# Altium integrated library Integrated_Library - 02.02.25 - 22.49.IntLib: 792 symbols (part 4 of 11)
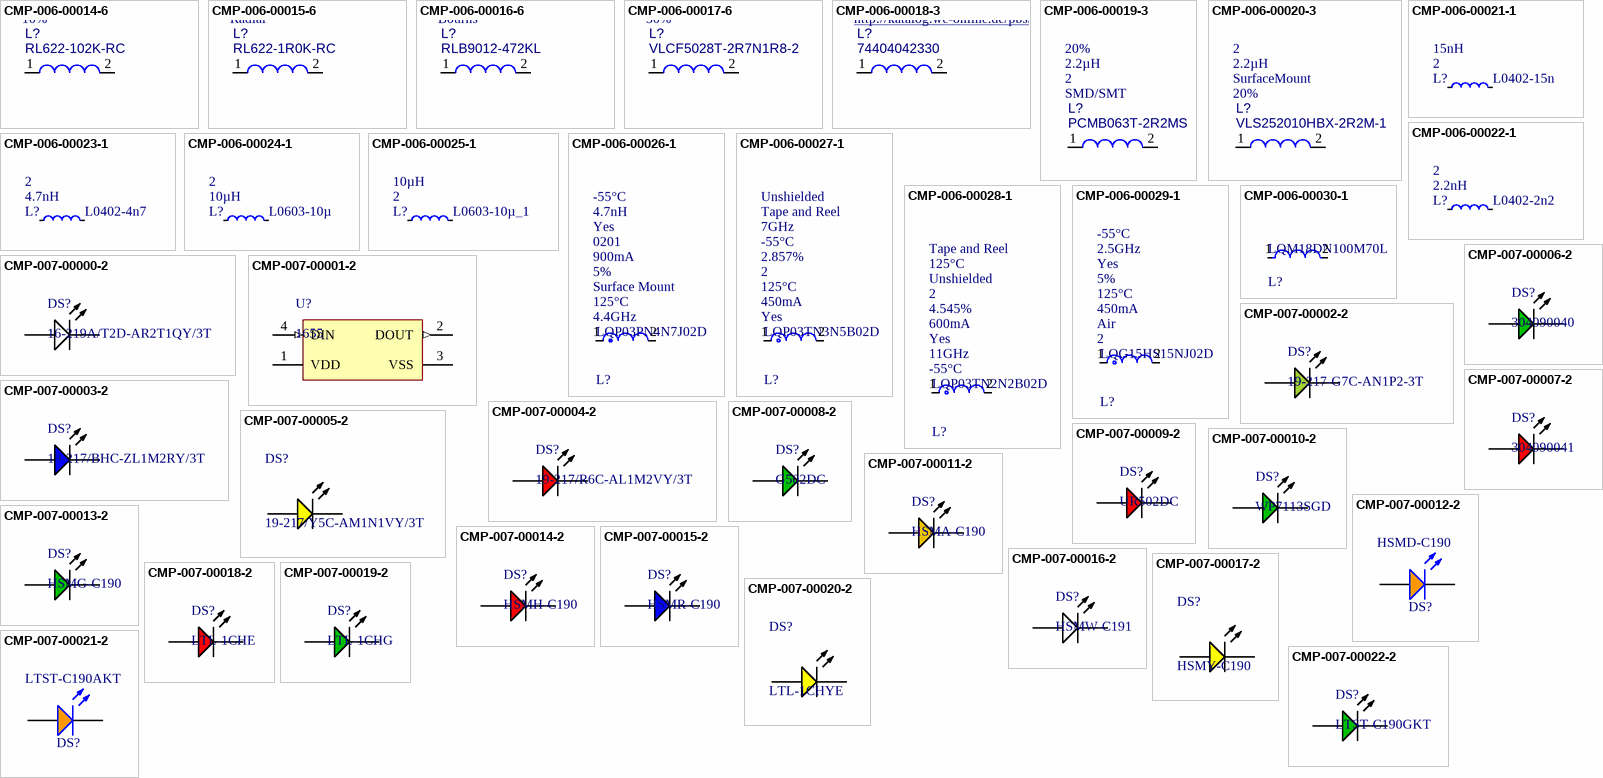
[diagram p29: symbols CMP-006-00014-6 to CMP-007-00022-2]

## CMP-006-00027-1
designator L?, comment LQP03TN3N5B02D  RoHS Compliant: Yes  Max Current Rating: 450mA  Max Operating Temperature: 125°C  Pins: 2  Tolerance: 2.857%  Min Operating Temperature: -55°C  Self Resonant Frequency: 7GHz  Packaging: Tape and Reel  Shielding: Unshielded
General Purpose Inductor, 0.0035uH, 2.857%, 1 Element, SMD, 0201; DC Resistance (DCR): 250mR; Package Height: 0.3mm; Case/Size Code: 0201; Quality Factor-Min (at L-nom): 14; Shape/Size Description: RECTANGULAR PACKAGE; Inductor Application: RF INDUCTOR; Package Length: 0.6mm; Channels: 1; Test Frequency: 500MHz; Inductor Type: GENERAL PURPOSE INDUCTOR; Terminal Placement: Dual Ended; Terminal Finish: Tin; Construction: Chip; Termination: Wraparound; Package Width: 0.3mm; Inductance-Nom (L): 0.0035uH; JESD-609 Code: e3; Surface Mount: Yes; Package Style: SMTMeter; Reach SVHC Compliant: Yes
footprint FP-LQP03TG_02-IPC_B
pins: 1, 2

## CMP-006-00028-1
designator L?, comment LQP03TN2N2B02D  Min Operating Temperature: -55°C  Self Resonant Frequency: 11GHz  RoHS Compliant: Yes  Max Current Rating: 600mA  Tolerance: 4.545%  Pins: 2  Shielding: Unshielded  Max Operating Temperature: 125°C  Packaging: Tape and Reel
General Purpose Inductor, 0.0022uH, 4.545%, 1 Element, SMD, 0201; Package Width: 0.3mm; Inductor Application: RF INDUCTOR; Package Length: 0.6mm; Test Frequency: 500MHz; Channels: 1; Case/Size Code: 0201; Shape/Size Description: RECTANGULAR PACKAGE; DC Resistance (DCR): 150mR; Quality Factor-Min (at L-nom): 14; Terminal Placement: Dual Ended; Surface Mount: Yes; Reach SVHC Compliant: Yes; Inductance-Nom (L): 0.0022uH; Construction: Chip; JESD-609 Code: e3; Terminal Finish: Nickel; Inductor Type: GENERAL PURPOSE INDUCTOR; Package Style: SMTMeter; Termination: Wraparound; Package Height: 0.3mm
footprint FP-LQP03TG_02-IPC_B-32
pins: 1, 2

## CMP-006-00029-1
designator L?, comment LQG15HS15NJ02D  Pins: 2  Core Material: Air  Max Current Rating: 450mA  Max Operating Temperature: 125°C  Tolerance: 5%  RoHS Compliant: Yes  Self Resonant Frequency: 2.5GHz  Min Operating Temperature: -55°C
General Purpose Inductor, 0.015uH, 5%, 1 Element, Air-Core, SMD, 0402; DC Resistance (DCR): 320mR; Case/Size Code: 0402; Construction: Multilayer Chip
footprint FP-LQG15HH_02-MFG
footprint FP-LQG15HH_02-IPC_B
footprint FP-LQG15HH_02-IPC_A
footprint FP-LQG15HH_02-IPC_C
pins: 1, 2

## CMP-006-00030-1
designator L?, comment LQM18DN100M70L
General Purpose Inductor, 10uH, 20%, 1 Element, Ferrite-Core, SMD, 0603
footprint FP-LQM18DN_70-IPC_C
footprint FP-LQM18DN_70-IPC_B
footprint FP-LQM18DN_70-IPC_A
footprint FP-LQM18DN_70-MFG
pins: 1, 2

## CMP-007-00000-2
designator DS?, comment 16-219A/T2D-AR2T1QY/3T
Chip LED, White, 5 V, 10 mA, 30 mW, -40 to 85 degC, 2-Pin SMD (0402), RoHS, Tape and Reel; Manufacturer: Everlight Electronics; Luminous Intensity: 360mcd; Forward Voltage: 2.6V; Viewing Angle: 130degrees; Power: 30mW; Forward Current: 5mA; Package Quantity: 3000; Max Operating Temperature: 85°C; Datasheet Version: Rev. 5, 04/2013; Datasheet URL: http://www.everlight.com/file/ProductFile/16-219A-T2D-AR2T1QY-3T.pdf; Package Reference: 0402; Mounting Technology: SM; Case/Package: 0402; Illumination Colour: White; Manufacturer URL: http://www.everlight.com/; Package Description: 2-Pin Surface Mount Device, Body 1 x 0.5 mm; RoHS Compliant: True; Packaging: TapeandReel; Min Operating Temperature: -40°C
footprint EVRL-0402-2_V (SMD, 2-Leads, Body 1x0.5mm)
pins: 1 A, 2 K

## CMP-007-00001-2
designator U?, comment 1655
Intelligent Control LED Integrated Light Source, 3.5 to 5.3 V, -25 to 80 degC, 4-Pin SMD, RoHS, Tape and Reel; Manufacturer: Adafruit Industries; RoHS Compliant: True; Case/Package: 1655; Package Description: 4-Pin Surface Mount Device, Body 5 x 5 mm; Manufacturer URL: https://www.adafruit.com/; Package Reference: 1655; Datasheet URL: http://datasheet.octopart.com/ADA1655-Adafruit-Industries-datasheet-32028139.pdf; Datasheet Version: May-13; Mounting Technology: SM
footprint ADA-RGB-1655_V (SMD, 4-Leads, Body 5x5mm)
pins: 1 VDD (power), 2 DOUT (out), 3 VSS (power), 4 DIN (in)

## CMP-007-00002-2
designator DS?, comment 19-217-G7C-AN1P2-3T
Chip LED, Yellow-Green, 5 V, 25 mA, -40 to 85 degC, 2-Pin SMD (0603), RoHS, Tape and Reel; Manufacturer: Everlight Electronics; Forward Voltage: 2V; Lens Style: Clear; Viewing Angle: 120degrees; Colour: Green; Mounting Technology: SM; Datasheet Version: Rev. 1, 04/2006; Package Description: 2-Pin Surface Mount Device, Body 1.6 x 0.8 mm; RoHS Compliant: True; Package Reference: 0603; Pins: 2; Manufacturer URL: http://www.everlight.com/; Datasheet URL: https://datasheet.ciiva.com/48679/19-217-g7c-an1p2-3t-48679179.pdf; Case/Package: 0603
footprint EVRL-0603-2_V (SMD, 2-Leads, Body 1.6x0.8mm)
pins: 1 A, 2 K

## CMP-007-00003-2
designator DS?, comment 19-217/BHC-ZL1M2RY/3T
Chip LED, Blue, 5 V, 25 mA, -40 to 85 degC, 2-Pin SMD (0603), RoHS, Tape and Reel; Manufacturer: Everlight Electronics; Luminous Intensity: 28.5mcd; Viewing Angle: 120degrees; Forward Current: 25mA; Lens Style: Diffused; Forward Voltage: 3V; Pins: 2; Max Operating Temperature: 85°C; Manufacturer URL: http://www.everlight.com/; Datasheet URL: https://datasheet.ciiva.com/26901/getdatasheetpartid-420616-26901324.pdf; Package Reference: 0603; RoHS Compliant: True; Packaging: TapeandReel; Package Description: 2-Pin Surface Mount Device, Body 1.6 x 0.8 mm; Mounting Technology: SM; Datasheet Version: Rev. 1.0, 03/2003; Min Operating Temperature: -40°C; Case/Package: 0603; Colour: Blue
footprint EVRL-0603-2_V (SMD, 2-Leads, Body 1.6x0.8mm)
pins: 1 A, 2 K

## CMP-007-00004-2
designator DS?, comment 19-217/R6C-AL1M2VY/3T
Chip LED, Red, 5 V, 25 mA, -40 to 85 degC, 2-Pin SMD (0603), RoHS, Tape and Reel; Manufacturer: Everlight Electronics; Forward Voltage: 2.2V; Lens Style: Clear; Package Reference: 0603; Datasheet Version: Rev. 1, 01/2005; Mounting Technology: SM; RoHS Compliant: False; Datasheet URL: https://datasheet.ciiva.com/4688/el-19-217-r6c-al1m2vy-3tpdf-187026-4688713.pdf; Case/Package: 0603; Colour: Red; Manufacturer URL: http://www.everlight.com/; Package Description: 2-Pin Surface Mount Device, Body 1.6 x 0.8 mm
footprint EVRL-0603-2_V (SMD, 2-Leads, Body 1.6x0.8mm)
pins: 1 A, 2 K

## CMP-007-00005-2
designator DS?, comment 19-217/Y5C-AM1N1VY/3T
Chip LED, Yellow, 5 V, 25mA, -40 to 85 degC, 2-Pin SMD (0603), RoHS, Tape and Reel; Manufacturer: Everlight Electronics; Datasheet Version: Rev. 1.0, 12/2005; Package Reference: 0603; Mounting Technology: SM; Package Description: 2-Pin Surface Mount Device, Body 1.6 x 0.8 mm; Case/Package: 0603; Datasheet URL: http://www.fairchip.com/pdf/Everlight/19-217-Y5C-AM1N1VY-3T.pdf; Manufacturer URL: http://www.everlight.com/; RoHS Compliant: False
footprint EVRL-0603-2_V (SMD, 2-Leads, Body 1.6x0.8mm)
pins: 1 A, 2 K

## CMP-007-00006-2
designator DS?, comment 304090040
Green LED, 80 mW, 20 mA, -25 to 85 degC, 2-Pin THD; Manufacturer: Shenzhen CGX; Manufacturer URL: http://szcgx.com/; Package Reference: 304090040; Datasheet Version: Rev. 1.0, 09/2014; RoHS Compliant: Unknown; Case/Package: 304090040; Package Description: 2-Pin Through Hole Device, Dia 3 mm, Pitch 2.28 mm; Datasheet URL: http://datasheet.octopart.com/304090040-Chengguangxing-datasheet-62330655.pdf; Mounting Technology: TH
footprint LED-2P-2.28-3MM (LED, 2-Leads, Dia 3mm, Pitch 2.28mm)
pins: 1 A, 2 K

## CMP-007-00007-2
designator DS?, comment 304090041
Red LED, 80 mW, 30 mA, -25 to 85 degC, 2-Pin THD; Manufacturer: Shenzhen CGX; Package Description: 2-Pin Through Hole Device, Dia 3 mm, Pitch 2.28 mm; Datasheet URL: http://datasheet.octopart.com/304090041-Chengguangxing-datasheet-62330656.pdf; Mounting Technology: TH; Manufacturer URL: http://szcgx.com/; RoHS Compliant: Unknown; Datasheet Version: Sep-14; Case/Package: 304090041; Package Reference: 304090041
footprint LED-2P-2.28-3MM_A (LED, 2-Leads, Dia 3mm, Pitch 2.28mm)
pins: 1 A, 2 K

## CMP-007-00008-2
designator DS?, comment G502DC
Green LED, 80 mW, 20 mA, -25 to 85 degC, 2-Pin THD; Manufacturer: Shenzhen CGX; Mounting Technology: TH; Package Reference: G502DC; Datasheet Version: Sep-14; Manufacturer URL: http://szcgx.com/; Package Description: 2-Pin Through Hole Device, Dia 5.9 mm; Datasheet URL: http://datasheet.octopart.com/G502DC-Chengguangxing-datasheet-62330340.pdf; Case/Package: G502DC; RoHS Compliant: Unknown
footprint CGX-G502DC (THD, 2-Leads, Dia 5.9mm, Pin Spacing 2.54mm)
pins: 1 A, 2 K

## CMP-007-00009-2
designator DS?, comment UR502DC
Red LED, 80 mW, 30 mA, -25 to 85 degC, 2-Pin THD; Manufacturer: Shenzhen CGX; Power: 80mW; Case/Package: UR502DC; RoHS Compliant: Unknown; Package Description: 2-Pin Through Hole Device, Dia 5.9 mm, Height 9.1 mm; Manufacturer URL: http://szcgx.com/; Datasheet Version: Sep-14; Package Reference: UR502DC; Datasheet URL: http://datasheet.octopart.com/UR502DC-Chengguangxing-datasheet-62330342.pdf; Mounting Technology: TH
footprint CGX-UR502DC (THD, 2-Leads, Dia 5.9mm, Pin Spacing 2.54mm)
pins: 1 A, 2 K

## CMP-007-00010-2
designator DS?, comment WP7113SGD
LED Green, 62.5 mW, 25 mA, -40 to 85 degC, 2-Pin THD, RoHS, Bulk; Manufacturer: Kingbright; Lens Style: Dome; Nominal Vf: 2.2V; Power: 62.5mW; Luminous Intensity: 40mcd; Viewing Angle: 30degrees; Datasheet URL: http://www.kingbrightusa.com/images/catalog/SPEC/WP7113SGD.pdf; Datasheet Version: Rev. 6B, 01/2015; Illumination Colour: Green; Package Quantity: 1000; Package Description: 2-Pin Through Hole Device, Dia 5.9 mm, Body Length 8.6 mm; Colour: Green; Case/Package: Radial; RoHS Compliant: True; Package Reference: WP7113SGD; Mounting Technology: TH; Packaging: Bulk; Forward Voltage: 2.2V
footprint KING-WP7113SGD_V (THD, 2-Leads, Dia 5.9mm, Body Length 8.6mm)
pins: 1 A, 2 K

## CMP-007-00011-2
designator DS?, comment HSMA-C190
LED Uni-Color Amber, 60 mW, 20 mA, -40 to 85 degC, 2-Pin SMD, RoHS, Tape and Reel; Manufacturer: Avago; Forward Current: 20mA; Colour: Orange; Luminous Intensity: 90mcd; Lens Style: Diffused; Power: 60mW; Nominal Vf: 1.9V; Viewing Angle: 170degrees; Datasheet Version: Sep-10; Mounting Technology: SM; Case/Package: 0603; RoHS Compliant: True; Pins: 2; Packaging: TapeandReel; Package Reference: HSMX-C190; Manufacturer URL: http://www.avagotech.com/; Package Quantity: 4000; Min Operating Temperature: -40°C; Datasheet URL: http://docs.avagotech.com/docs/AV02-0112EN; Max Operating Temperature: 85°C; Forward Voltage: 1.9V; Package Description: 2-Pin Surface Mount Device, Body 1.6 x 0.8 mm, Height 0.9 mm; Illumination Colour: Orange
footprint AVAG-HSMX-C190_V (SMD, 2-Leads, Body 1.6x0.8mm, Height 0.9mm)
pins: 1 A, 2 K

## CMP-007-00012-2
designator DS?, comment HSMD-C190
LED Uni-Color Orange, 52 mW, 20 mA, -40 to 85 degC, 2-Pin SMD, RoHS, Tape and Reel; Manufacturer: Avago; Lens Style: Diffused; Forward Voltage: 2.2V; Forward Current: 20mA; Viewing Angle: 170degrees; Power: 52mW; Luminous Intensity: 8mcd; Min Operating Temperature: -40°C; Packaging: TapeandReel; Colour: Orange; Nominal Vf: 2.2V; Pins: 2; Case/Package: 0603; Max Operating Temperature: 85°C; Illumination Colour: Orange; Package Description: 2-Pin Surface Mount Device, Body 1.6 x 0.8 mm, Height 0.9 mm; Manufacturer URL: http://www.avagotech.com/; Datasheet Version: Mar-12; RoHS Compliant: True; Datasheet URL: http://docs.avagotech.com/docs/AV02-0551EN; Mounting Technology: SM; Package Reference: HSMX-C190; Package Quantity: 4000
footprint AVAG-HSMX-C190_V (SMD, 2-Leads, Body 1.6x0.8mm, Height 0.9mm)
pins: 1 A, 2 K

## CMP-007-00013-2
designator DS?, comment HSMG-C190
LED Uni-Color Green, 52 mW, 20 mA, -40 to 85 degC, 2-Pin SMD, RoHS, Tape and Reel; Manufacturer: Avago; Forward Current: 20mA; Viewing Angle: 170degrees; Luminous Intensity: 15mcd; Lens Style: Diffused; Forward Voltage: 2.2V; Power: 52mW; Mounting Technology: SM; RoHS Compliant: True; Packaging: TapeandReel; Illumination Colour: Green; Datasheet URL: http://docs.avagotech.com/docs/AV02-0551EN; Min Operating Temperature: -40°C; Max Operating Temperature: 85°C; Pins: 2; Package Description: 2-Pin Surface Mount Device, Body 1.6 x 0.8 mm, Height 0.9 mm; Nominal Vf: 2.2V; Case/Package: 0603; Manufacturer URL: http://www.avagotech.com/; Datasheet Version: Mar-12; Colour: Green; Package Reference: HSMX-C190; Package Quantity: 4000
footprint AVAG-HSMX-C190_V (SMD, 2-Leads, Body 1.6x0.8mm, Height 0.9mm)
pins: 1 A, 2 K

## CMP-007-00014-2
designator DS?, comment HSMH-C190
LED Uni-Color Red, 65 mW, 20 mA, -40 to 85 degC, 2-Pin SMD, RoHS, Tape and Reel; Manufacturer: Avago; Nominal Vf: 1.8V; Luminous Intensity: 17mcd; Power: 78mW; Forward Current: 20mA; Lens Style: Diffused; Viewing Angle: 170degrees; Package Quantity: 4000; Colour: Red; Manufacturer URL: http://www.avagotech.com/; Min Operating Temperature: -40°C; Datasheet URL: http://docs.avagotech.com/docs/AV02-0551EN; RoHS Compliant: True; Forward Voltage: 1.8V; Pins: 2; Max Operating Temperature: 85°C; Packaging: TapeandReel; Package Reference: HSMX-C190; Datasheet Version: Mar-12; Package Description: 2-Pin Surface Mount Device, Body 1.6 x 0.8 mm, Height 0.9 mm; Case/Package: 0603; Mounting Technology: SM; Illumination Colour: Red
footprint AVAG-HSMX-C190_V (SMD, 2-Leads, Body 1.6x0.8mm, Height 0.9mm)
pins: 1 A, 2 K

## CMP-007-00015-2
designator DS?, comment HSMR-C190
LED Uni-Color Blue, 78 mW, 20 mA, -40 to 85 degC, 2-Pin SMD, RoHS, Tape and Reel; Manufacturer: Avago; Forward Voltage: 3.4V; Power: 78mW; Forward Current: 20mA; Luminous Intensity: 55mcd; Lens Style: Diffused; Viewing Angle: 155degrees; Pins: 2; Max Operating Temperature: 85°C; Colour: Blue; Datasheet Version: Apr-10; RoHS Compliant: True; Mounting Technology: SM; Min Operating Temperature: -40°C; Illumination Colour: Blue; Package Quantity: 4000; Datasheet URL: http://docs.avagotech.com/docs/AV02-0977EN; Package Reference: HSMX-C190; Packaging: TapeandReel; Nominal Vf: 3.4V; Case/Package: 0603; Package Description: 2-Pin Surface Mount Device, Body 1.6 x 0.8 mm, Height 0.9 mm; Manufacturer URL: http://www.avagotech.com/
footprint AVAG-HSMX-C190_V (SMD, 2-Leads, Body 1.6x0.8mm, Height 0.9mm)
pins: 1 A, 2 K

## CMP-007-00016-2
designator DS?, comment HSMW-C191
LED Uni-Color White, 78 mW, 20 mA, -40 to 85 degC, 2-Pin SMD, RoHS, Tape and Reel; Manufacturer: Avago; Power: 78mW; Lens Style: Diffused; Luminous Intensity: 200mcd; Forward Voltage: 3.6V; Viewing Angle: 140degrees; Forward Current: 20mA; Illumination Colour: White; Package Quantity: 4000; Mounting Technology: SM; Colour: White; Case/Package: 0603; Package Reference: HSMW-C191; Datasheet Version: May-10; Pins: 2; Package Description: 2-Pin Surface Mount Device, Body 1.6 x 0.8 mm; Min Operating Temperature: -40°C; RoHS Compliant: True; Packaging: TapeandReel; Manufacturer URL: http://www.avagotech.com/; Datasheet URL: http://docs.avagotech.com/docs/AV02-0186EN; Nominal Vf: 3.6V; Max Operating Temperature: 85°C
footprint AVAG-HSMW-C191_V (SMD, 2-Leads, Body 1.6x0.8mm)
pins: 1 A, 2 K

## CMP-007-00017-2
designator DS?, comment HSMY-C190
LED Uni-Color Yellow, 65 mW, 20 mA, -40 to 85 degC, 2-Pin SMD, RoHS, Tape and Reel; Manufacturer: Avago; Forward Current: 20mA; Viewing Angle: 170degrees; Power: 52mW; Lens Style: Diffused; Nominal Vf: 2.1V; Luminous Intensity: 8mcd; Max Operating Temperature: 85°C; Package Quantity: 4000; Package Description: 2-Pin Surface Mount Device, Body 1.6 x 0.8 mm, Height 0.9 mm; Packaging: TapeandReel; Case/Package: 0603; Datasheet Version: Mar-12; Min Operating Temperature: -40°C; Pins: 2; Illumination Colour: Yellow; Package Reference: HSMX-C190; Colour: Yellow; Manufacturer URL: http://www.avagotech.com/; Datasheet URL: http://docs.avagotech.com/docs/AV02-0551EN; Forward Voltage: 2.1V; RoHS Compliant: True; Mounting Technology: SM
footprint AVAG-HSMX-C190_V (SMD, 2-Leads, Body 1.6x0.8mm, Height 0.9mm)
pins: 1 A, 2 K

## CMP-007-00018-2
designator DS?, comment LTL-1CHE
LED Uni-Color Red, 100 mW, 30 mA, -55 to 100 degC, 2-Pin THD, RoHS, Bulk; Manufacturer: Lite-On; Forward Current: 20mA; Nominal Vf: 2V; Viewing Angle: 60degrees; Luminous Intensity: 12.6mcd; Lens Style: Dome; Pins: 2; RoHS Compliant: True; Package Reference: LTL-1CHE; Package Quantity: 1000; Mounting Technology: TH; Min Operating Temperature: -55°C; Colour: Red; Case/Package: Radial; Manufacturer URL: http://www.us.liteon.com/; Datasheet URL: https://datasheet.ciiva.com/15117/getdatasheetpartid-187746-15117985.pdf; Forward Voltage: 2V; Max Operating Temperature: 100°C; Illumination Colour: Red; Package Description: 2-Pin Through Hole Device, Dia 3.8 mm, Pitch 2.54 mm; Packaging: Bulk; Datasheet Version: Dec-03
footprint INDPR60-254-520X380X650 (THD, 2-Leads, Dia 3.8mm, Pitch 2.54mm)
pins: 1 A, 2 K

## CMP-007-00019-2
designator DS?, comment LTL-1CHG
LED Uni-Color Green, 100 mW, 30 mA, -55 to 100 degC, 2-Pin THD, RoHS, Bulk; Manufacturer: Lite-On; Power: 100mW; Forward Voltage: 2.6V; Forward Current: 30mA; Nominal Vf: 2.1V; Lens Style: Dome; Viewing Angle: 60degrees; Luminous Intensity: 12.6mcd; Max Operating Temperature: 100°C; Case/Package: Radial; Package Reference: LTL-1CHG; Manufacturer URL: http://www.us.liteon.com/; Package Quantity: 1000; Colour: Green; Packaging: Bulk; RoHS Compliant: True; Datasheet URL: http://datasheet.octopart.com/LTL-1CHG-Lite-On-datasheet-143841.pdf; Package Description: 2-Pin Through Hole Device, Dia 3.8 mm; Min Operating Temperature: -55°C; Mounting Technology: TH; Pins: 2; Illumination Colour: Green; Datasheet Version: Mar-00
footprint LTST-LTL-1CHG-2 (TH, 2-Leads, Dia 3.8mm)
pins: 1 A, 2 K

## CMP-007-00020-2
designator DS?, comment LTL-1CHYE
LED Uni-Color Yellow, 60 mW, 20 mA, -55 to 100 degC, 2-Pin THD, RoHS, Bulk; Manufacturer: Lite-On; Nominal Vf: 2.1V; Luminous Intensity: 40mcd; Lens Style: Dome; Forward Current: 20mA; Viewing Angle: 45degrees; Max Operating Temperature: 100°C; Case/Package: Radial; Min Operating Temperature: -55°C; Colour: Yellow; Datasheet Version: Rev. B, 07/2013; Packaging: Bulk; Illumination Colour: Yellow; Package Quantity: 1000; Pins: 2; Package Reference: LTL-1CHYE; Forward Voltage: 2.1V; Mounting Technology: TH; Datasheet URL: https://datasheet.ciiva.com/4269/s-110-ltl-1chye-4269126.pdf; RoHS Compliant: True; Package Description: 2-Pin Through Hole Device, Dia 3.8 mm, Pitch 2.54 mm; Manufacturer URL: http://www.us.liteon.com/
footprint LTST-LTL-1CHYE (THD, 2-Leads, Dia 3.8mm, Pitch 2.54mm)
pins: 1 A, 2 K

## CMP-007-00021-2
designator DS?, comment LTST-C190AKT
LED Uni-Color Orange, 100 mW, 30 mA, -55 to 85 degC, 2-Pin SMD, RoHS, Tape and Reel; Manufacturer: Lite-On; Lens Style: Clear; Forward Voltage: 2.1V; Luminous Intensity: 2mcd; Forward Current: 20mA; Viewing Angle: 130degrees; Package Reference: LTST-C190AKT-2; Case/Package: 0603; Min Operating Temperature: -55°C; Package Quantity: 3000; Illumination Colour: Orange; RoHS Compliant: True; Mounting Technology: SM; Manufacturer URL: http://www.us.liteon.com/; Datasheet URL: http://datasheet.octopart.com/LTST-C190AKT-Lite-On-datasheet-11729267.pdf; Pins: 2; Max Operating Temperature: 85°C; Packaging: TapeandReel; Colour: Orange; Nominal Vf: 2.1V; Datasheet Version: Jan-03; Package Description: 2-Pin Surface Mount Device, Body 1.6 x 0.8 mm
footprint LTST-C190AKT-2_V (SMD, 2-Leads, Body 1.6x0.8mm)
pins: 1 A, 2 K

## CMP-007-00022-2
designator DS?, comment LTST-C190GKT
LED Uni-Color Green, 100 mW, 30 mA, -55 to 85 degC, 2-Pin SMD, RoHS, Tape and Reel; Manufacturer: Lite-On; Power: 100mW; Forward Voltage: 2.1V; Viewing Angle: 130degrees; Forward Current: 20mA; Luminous Intensity: 6mcd; Lens Style: Clear; Manufacturer URL: http://www.us.liteon.com/; RoHS Compliant: True; Colour: Green; Package Description: 2-Pin Surface Mount Device, Body 1.6 x 0.8 mm; Datasheet URL: http://datasheet.octopart.com/LTST-C190GKT-Lite-On-datasheet-158530.pdf; Datasheet Version: Dec-06; Mounting Technology: SM; Case/Package: 0603; Package Reference: C190GKT; Packaging: TapeandReel; Min Operating Temperature: -55°C; Nominal Vf: 2.1V; Package Quantity: 3000; Illumination Colour: Green; Max Operating Temperature: 85°C; Pins: 2
footprint LTST-C190GKT_V (SMD, 2-Leads, Body 1.6x0.8mm)
pins: 1 A, 2 K

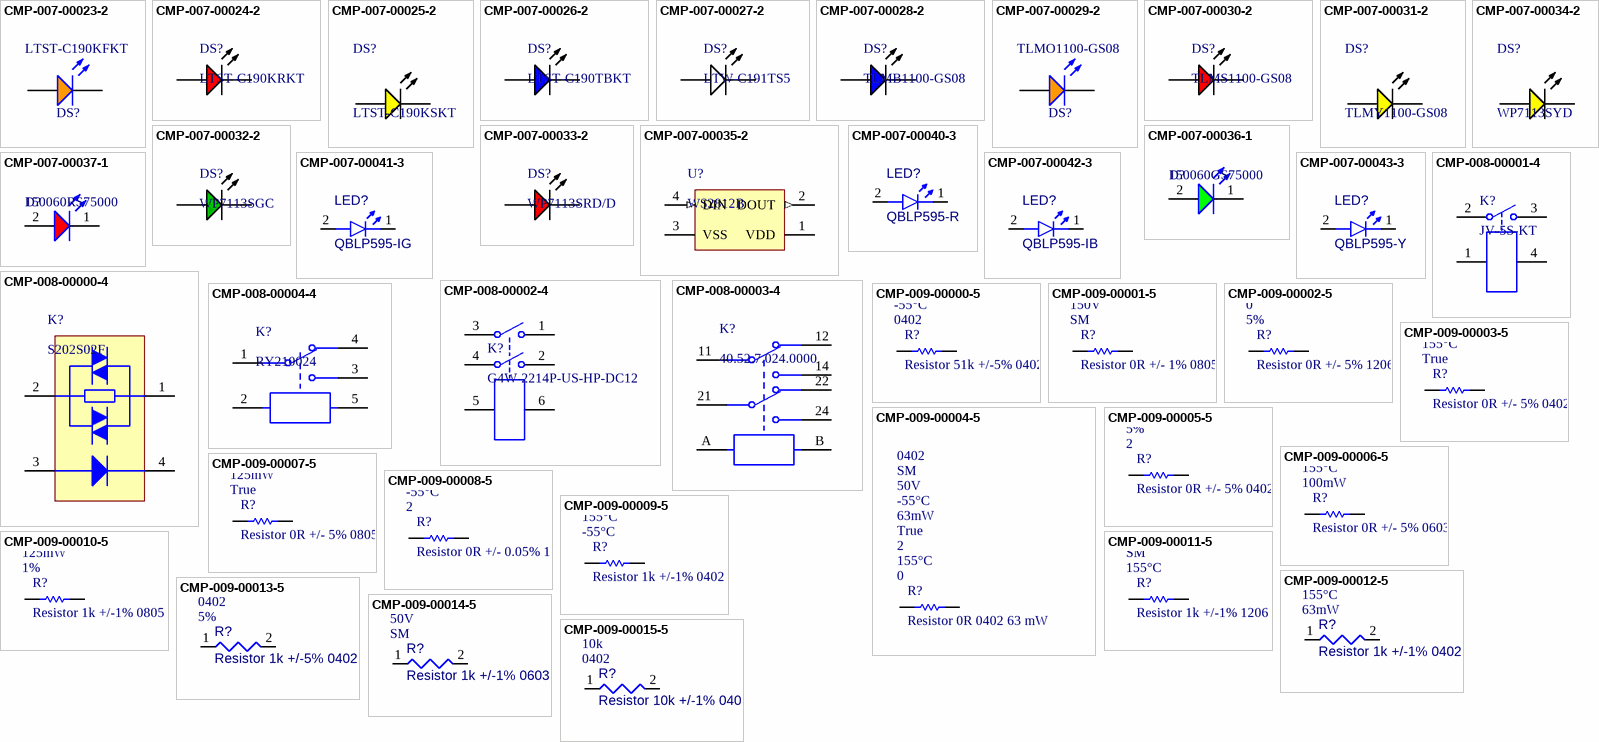
[diagram p9: symbols CMP-007-00023-2 to CMP-009-00015-5]

## CMP-007-00023-2
designator DS?, comment LTST-C190KFKT
LED Uni-Color Orange, 75 mW, 30 mA, -35 to 85 degC, 2-Pin SMD, RoHS, Tape and Reel; Manufacturer: Lite-On; Power: 75mW; Luminous Intensity: 90mcd; Nominal Vf: 2V; Lens Style: Diffused; Forward Current: 20mA; Viewing Angle: 130degrees; Max Operating Temperature: 85°C; Manufacturer URL: http://www.us.liteon.com/; Package Description: 2-Pin Surface Mount Device, Body 1.6 x 0.8 mm; Package Quantity: 3000; Pins: 2; Min Operating Temperature: -55°C; Mounting Technology: SM; Colour: Orange; Packaging: TapeandReel; Case/Package: 0603; Datasheet Version: Rev. I, 09/2011; Illumination Colour: Orange; Datasheet URL: http://optoelectronics.liteon.com/upload/download/DS-22-99-0186/S_110_LTST-C190KFKT.pdf; Package Reference: C190KFKT; RoHS Compliant: True; Forward Voltage: 2V
footprint LTST-C190KFKT_V (SMD, 2-Leads, Body 1.6x0.8mm)
pins: 1 A, 2 K

## CMP-007-00024-2
designator DS?, comment LTST-C190KRKT
LED Uni-Color Red, 62.5 mW, 25 mA, -30 to 85 degC, 2-Pin SMD, RoHS, Tape and Reel; Manufacturer: Lite-On; Power: 75mW; Forward Voltage: 2V; Luminous Intensity: 54mcd; Lens Style: Diffused; Viewing Angle: 130degrees; Forward Current: 20mA; Manufacturer URL: http://www.us.liteon.com/; Case/Package: 0603; Datasheet Version: Rev. F, 05/2013; Package Reference: C191KRKT; Datasheet URL: http://optoelectronics.liteon.com/upload/download/DS-22-99-0151/S_110_LTST-C190KRKT.pdf; Package Description: 2-Pin Surface Mount Device, Body 1.6 x 0.8 mm; Nominal Vf: 2V; Packaging: TapeandReel; RoHS Compliant: True; Pins: 2; Illumination Colour: Red; Colour: Red; Mounting Technology: SM; Package Quantity: 3000; Min Operating Temperature: -55°C; Max Operating Temperature: 85°C
footprint LTST-C191KRKT_V (SMD, 2-Leads, Body 1.6x0.8mm)
pins: 1 A, 2 K

## CMP-007-00025-2
designator DS?, comment LTST-C190KSKT
LED Uni-Color Yellow, 75 mW, 30 mA, -30 to 85 degC, 2-Pin SMD, RoHS, Tape and Reel; Manufacturer: Lite-On; Lens Style: Diffused; Forward Current: 20mA; Nominal Vf: 2.1V; Forward Voltage: 2V; Luminous Intensity: 28mcd; Viewing Angle: 130degrees; Power: 75mW; Case/Package: 0603; Datasheet URL: http://optoelectronics.liteon.com/upload/download/DS-22-99-0189/S_110_LTST-C190KSKT.pdf; Min Operating Temperature: -55°C; Illumination Colour: Yellow; Package Quantity: 3000; Datasheet Version: Rev. I, 10/2012; Colour: Yellow; Package Reference: C190KSKT; Package Description: 2-Pin Surface Mount Device, Body 1.6 x 0.8 mm; Max Operating Temperature: 85°C; Manufacturer URL: http://www.us.liteon.com/; Pins: 2; Mounting Technology: SM; RoHS Compliant: True; Packaging: TapeandReel
footprint LTST-C190KSKT_V (SMD, 2-Leads, Body 1.6x0.8mm)
pins: 1 A, 2 K

## CMP-007-00026-2
designator DS?, comment LTST-C190TBKT
LED Uni-Color Blue, 76 mW, 20 mA, -20 to 80 degC, 2-Pin SMD, RoHS, Tape and Reel; Manufacturer: Lite-On; Forward Voltage: 2.8V; Lens Style: Diffused; Luminous Intensity: 28mcd; Forward Current: 20mA; Viewing Angle: 130degrees; Nominal Vf: 3.3V; Packaging: TapeandReel; Min Operating Temperature: -20°C; Illumination Colour: Blue; Package Quantity: 3000; Pins: 2; Mounting Technology: SM; Package Reference: C190TBKT-2; Package Description: 2-Pin Surface Mount Device, Body 1.6 x 0.8 mm; RoHS Compliant: True; Datasheet URL: http://optoelectronics.liteon.com/upload/download/DS-22-99-0224/S_110_LTST-C190TBKT(0630).pdf; Datasheet Version: Rev. K, 08/2011; Manufacturer URL: http://www.us.liteon.com/; Colour: Blue; Case/Package: 0603; Max Operating Temperature: 80°C
footprint LTST-C190TBKT-2_V (SMD, 2-Leads, Body 1.6x0.8mm)
pins: 1 A, 2 K

## CMP-007-00027-2
designator DS?, comment LTW-C191TS5
LED Uni-Color White, 70 mW, 20 mA, -20 to 80 degC, 2-Pin SMD, RoHS, Tape and Reel; Manufacturer: Lite-On; Power: 70mW; Forward Current: 5mA; Viewing Angle: 130degrees; Luminous Intensity: 28mcd; Lens Style: Diffused; Nominal Vf: 2.93V; Forward Voltage: 3.15V; Pins: 2; Illumination Colour: White; Datasheet Version: Rev. B, 06/2010; Package Quantity: 1; Colour: White; Package Reference: LTW-C191TS5; Mounting Technology: SM; Package Description: 2-Pin Surface Mount Device, Body 1.6 x 0.8 mm; Manufacturer URL: http://www.us.liteon.com/; Datasheet URL: http://optoelectronics.liteon.com/upload/download/DS22-2004-201/S_110_LTW-C191TS5.pdf; Max Operating Temperature: 80°C; Case/Package: 0603; RoHS Compliant: True; Min Operating Temperature: -20°C; Packaging: TapeandReel
footprint LTST-LTW-C191TS5_V (SMD, 2-Leads, Body 1.6x0.8mm)
pins: 1 A, 2 K

## CMP-007-00028-2
designator DS?, comment TLMB1100-GS08
Blue LED, 10 mA, 3.9 V, -40 to 100 degC, 2-Pin SMD (0603), RoHS, Tape and Reel; Manufacturer: Vishay Semiconductor; Forward Voltage: 3.9V; Viewing Angle: 160degrees; Power: 68mW; Forward Current: 10mA; Lens Style: Diffused; Luminous Intensity: 5mcd; Case/Package: 0603; Datasheet URL: http://download.siliconexpert.com/pdfs/2016/8/7/12/43/26/667/vsh_/manual/379263299541529tlmb1100.pdf; Illumination Colour: Blue; Datasheet Version: Rev. 2.7, 03/2016; Manufacturer URL: http://www.vishay.com/; Package Reference: 0603; Min Operating Temperature: -40°C; Packaging: TapeandReel; RoHS Compliant: True; Nominal Vf: 3.9V; Mounting Technology: SM; Pins: 2; Package Description: 2-Pin Surface Mount Device, Body 1.6 x 0.8 mm; Colour: Blue; Package Quantity: 3000; Max Operating Temperature: 100°C
footprint VISH-TLMX1100-2_V (SMD, 2-Leads, Body 1.6x0.8mm)
pins: 1 A, 2 K

## CMP-007-00029-2
designator DS?, comment TLMO1100-GS08
Orange LED, 20 mA, 2.1 V, -40 to 100 degC, 2-Pin SMD (0603), RoHS, Tape and Reel; Manufacturer: Vishay Semiconductor; Lens Style: Diffused; Forward Current: 20mA; Viewing Angle: 160degrees; Nominal Vf: 2.1V; Power: 90mW; Luminous Intensity: 80mcd; Max Operating Temperature: 100°C; Manufacturer URL: http://www.vishay.com/; Datasheet URL: http://download.siliconexpert.com/pdfs/2016/8/7/12/43/26/667/vsh_/manual/379263299541529tlmb1100.pdf; Datasheet Version: Rev. 2.7, 03/2016; Illumination Colour: Orange; Package Quantity: 3000; Package Reference: 0603; Pins: 2; Min Operating Temperature: -40°C; Package Description: 2-Pin Surface Mount Device, Body 1.6 x 0.8 mm; RoHS Compliant: True; Case/Package: 0603; Mounting Technology: SM; Colour: Orange; Packaging: TapeandReel; Forward Voltage: 2.1V
footprint VISH-TLMX1100-2_V (SMD, 2-Leads, Body 1.6x0.8mm)
pins: 1 A, 2 K

## CMP-007-00030-2
designator DS?, comment TLMS1100-GS08
Red Led, 20mA, 2.1 V, -40 to 100 degC, 2-Pin SMD (0603), RoHS, Tape and Reel; Manufacturer: Vishay Semiconductor; Viewing Angle: 160degrees; Forward Voltage: 2.1V; Lens Style: Clear; Power: 90mW; Luminous Intensity: 63mcd; Datasheet Version: Rev. 2.7, 03/2016; Package Quantity: 3000; Colour: Red; Package Description: 2-Pin Surface Mount Device, Body 1.6 x 0.8 mm; Datasheet URL: http://www.vishay.com/docs/83173/tlmb1100.pdf; Package Reference: TLMX1100; Max Operating Temperature: 100°C; Mounting Technology: SM; Packaging: TapeandReel; Case/Package: 0603; Illumination Colour: Red; Forward Current: 20mA; Manufacturer URL: http://www.vishay.com/; RoHS Compliant: True; Min Operating Temperature: -40°C; Nominal Vf: 2.1V; Pins: 2
footprint VISH-TLMX1100_V (SMD, 2-Leads, Body 1.6x0.8mm)
pins: 1 A, 2 K

## CMP-007-00031-2
designator DS?, comment TLMY1100-GS08
Yellow LED, 20 mA, 2.1 V, -40 to 100 degC, 2-Pin SMD (0603), RoHS, Tape and Reel; Manufacturer: Vishay Semiconductor; Power: 90mW; Lens Style: Diffused; Nominal Vf: 2.1V; Forward Current: 20mA; Luminous Intensity: 80mcd; Viewing Angle: 160degrees; Manufacturer URL: http://www.vishay.com/; Package Reference: 0603; Packaging: TapeandReel; Case/Package: 0603; Datasheet Version: Rev. 2.7, 03/2016; Package Quantity: 3000; Forward Voltage: 2.1V; RoHS Compliant: True; Mounting Technology: SM; Datasheet URL: http://download.siliconexpert.com/pdfs/2016/8/7/12/43/26/667/vsh_/manual/379263299541529tlmb1100.pdf; Min Operating Temperature: -40°C; Pins: 2; Package Description: 2-Pin Surface Mount Device, Body 1.6 x 0.8 mm; Colour: Yellow; Max Operating Temperature: 100°C; Illumination Colour: Yellow
footprint VISH-TLMX1100-2_V (SMD, 2-Leads, Body 1.6x0.8mm)
pins: 1 A, 2 K

## CMP-007-00032-2
designator DS?, comment WP7113SGC
The Super Bright Green Source Color Device, 2.2 V, -40 to 85 degC, 2-Pin THD, RoHS, Tape and Reel; Manufacturer: Kingbright; Luminous Intensity: 200mcd; Nominal Vf: 2.2V; Viewing Angle: 20degrees; Lens Style: Clear; Mounting Technology: TH; Forward Voltage: 2.2V; Colour: Green; Package Quantity: 1000; Datasheet Version: Rev. 9B, 01/2015; RoHS Compliant: True; Case/Package: Radial; Package Description: 2-Pin Through Hole Device, Dia 5.9 mm, Body Length 8.6 mm; Packaging: Bulk; Illumination Colour: Green; Datasheet URL: http://www.kingbrightusa.com/images/catalog/SPEC/WP7113SGC.pdf; Package Reference: WP7113SGC
footprint KING-WP7113SGC_V (THD, 2-Leads, Dia 5.9mm, Body Length 8.6mm)
pins: 1 A, 2 K

## CMP-007-00033-2
designator DS?, comment WP7113SRD/D
The Super Bright Red Source Color Device, 1.85 V, -40 to 85 degC, 2-Pin THD, RoHS, Tape and Reel; Manufacturer: Kingbright; Nominal Vf: 1.85V; Luminous Intensity: 300mcd; Viewing Angle: 30degrees; Lens Style: Diffused; RoHS Compliant: True; Datasheet Version: Rev. 6A, 07/2016; Illumination Colour: Red; Case/Package: Radial; Package Reference: WP7113SRDD; Package Quantity: 500; Datasheet URL: http://www.kingbrightusa.com/images/catalog/SPEC/WP7113SRD-D.pdf; Colour: Red; Packaging: Bulk; Forward Voltage: 1.85V; Mounting Technology: TH; Package Description: 2-Pin Through Hole Device, Dia 5.9 mm, Body Length 8.6 mm
footprint KING-WP7113SRDD_V (THD, 2-Leads, Dia 5.9mm, Body Length 8.6mm)
pins: 1 A, 2 K

## CMP-007-00034-2
designator DS?, comment WP7113SYD
The Super Bright Yellow Source Color Device, 2 V, -40 to 85 degC, 2-Pin THD, RoHS, Tape and Reel; Manufacturer: Kingbright; Nominal Vf: 2V; Viewing Angle: 30degrees; Luminous Intensity: 600mcd; Forward Current: 20mA; Lens Style: Diffused; Datasheet Version: Rev. 7B, 01/2015; RoHS Compliant: True; Datasheet URL: http://www.kingbrightusa.com/images/catalog/SPEC/WP7113SYD.pdf; Illumination Colour: Yellow; Package Reference: WP7113SYD; Mounting Technology: TH; Package Quantity: 500; Packaging: Bulk; Package Description: 2-Pin Through Hole Device, Dia 5.9 mm, Body Length 8.6 mm; Case/Package: Radial; Colour: Yellow; Forward Voltage: 2V
footprint KING-WP7113SYD_V (THD, 2-Leads, Dia 5.9mm, Body Length 8.6mm)
pins: 1 A, 2 K

## CMP-007-00035-2
designator U?, comment WS2812B
Intelligent Control LED Integrated Light Source, 3.5 to 5.3 V, -25 to 80 degC, 4-Pin SMD, RoHS, Bulk; Manufacturer: Adafruit Industries; Datasheet URL: https://cdn-shop.adafruit.com/datasheets/WS2812B.pdf; Manufacturer URL: https://www.adafruit.com/; Datasheet Version: May-13; Case/Package: WS2812B; Mounting Technology: SM; RoHS Compliant: False; Package Description: 4-Pin Surface Mount Device, Body 5 x 5 mm, Pitch 3.3 mm; Package Reference: WS2812B
footprint ADAI-WS2812B_V (SMD, 4-Leads, Body 5x5mm, Pitch 3.3mm)
pins: 1 VDD (power) "Power supply LED", 2 DOUT (out) "Control data signal output", 3 VSS (power) "Ground", 4 DIN (in) "Control data signal input"

## CMP-007-00036-1
designator D?, comment 150060GS75000
Single Color LED, Green, Water Clear, 1.1mm; Luminous Intensity-Nom: 430mcd; Forward Current: 30mA; Max Operating Temperature: 85°C; Min Operating Temperature: -40°C; Mounting Technology: Surface Mount; Lens Style: WATER CLEAR; Pins: 2; RoHS Compliant: Yes; Color: Green
footprint WL-SMCW_0603_150060xx75000-28 (SMD Mono-color Chip LED, body 1.60 x 0.80 mm)
pins: 1 K, 2 A

## CMP-007-00037-1
designator D?, comment 150060RS75000
Single Color LED, Red, Water Clear, 1.1mm; Luminous Intensity-Nom: 250mcd; Forward Current: 30mA; RoHS Compliant: Yes; Lens Style: WATER CLEAR; Min Operating Temperature: -40°C; Max Operating Temperature: 85°C; Color: Red; Mounting Technology: Surface Mount; Pins: 2
footprint WL-SMCW_0603_150060xx75000 (SMD Mono-color Chip LED, body 1.60 x 0.80 mm)
pins: 1 K, 2 A

## CMP-007-00040-3
designator LED?, comment QBLP595-R
Chip LED 0402, Red, 0.02 A, 2.0 to 2.5 V, -40 to 80 degC, 2-Pin SMD, RoHS, Tape and Reel; Colour: Red; RoHS Compliant: Yes; Case/Package: 0402; Pins: 2; Mounting Technology: SMT
footprint QTB-QBLP595_V (SMD, 2-Leads, Body 1x0.5mm)
footprint QTB-QBLP595_V (SMD, 2-Leads, Body 1x0.5mm)
pins: 1 K, 2 A

## CMP-007-00041-3
designator LED?, comment QBLP595-IG
Chip LED 0402, Green, 0.02 A, 3.1 to 3.7 V, -40 to 80 degC, 2-Pin SMD, RoHS, Tape and Reel; Case/Package: 0402; Colour: Green; Mounting Technology: SMT; Pins: 2; RoHS Compliant: Yes
footprint QTB-QBLP595_V (SMD, 2-Leads, Body 1x0.5mm)
footprint QTB-QBLP595_V (SMD, 2-Leads, Body 1x0.5mm)
pins: 1 K, 2 A

## CMP-007-00042-3
designator LED?, comment QBLP595-IB
Chip LED 0402, Blue, 0.02 A, 3.1 to 3.7 V, -40 to 80 degC, 2-Pin SMD, RoHS, Tape and Reel; RoHS Compliant: Yes; Colour: Blue; Pins: 2; Case/Package: 0402; Mounting Technology: SMT
footprint QTB-QBLP595_V (SMD, 2-Leads, Body 1x0.5mm)
footprint QTB-QBLP595_V (SMD, 2-Leads, Body 1x0.5mm)
pins: 1 K, 2 A

## CMP-007-00043-3
designator LED?, comment QBLP595-Y
Chip LED 0402, Yellow, 0.02 A, 3.1 to 3.7 V, -40 to 80 degC, 2-Pin SMD, RoHS, Tape and Reel; Mounting Technology: SMT; Case/Package: 0402; RoHS Compliant: Yes; Pins: 2; Colour: Yellow
footprint QTB-QBLP595_V (SMD, 2-Leads, Body 1x0.5mm)
footprint QTB-QBLP595_V (SMD, 2-Leads, Body 1x0.5mm)
pins: 1 K, 2 A

## CMP-008-00000-4
designator K?, comment S202S02F
Zero Cross Type Triac Output SSR, 240 V, 8 A, -25 to 80 degC, 4-Pin THD, RoHS, Bulk; Manufacturer: Sharp; Max Ouput Current: 8A; Max Input Voltage: 1.4V; Mounting Technology: TH; Pins: 4; Package Description: 4-Pin Through Hole Device, Body 18.5 x 5.5 mm, Pitch 2.54 mm; RoHS Compliant: True; Datasheet Version: Apr-04; Package Quantity: 200; Datasheet URL: http://www.mouser.com/ds/2/365/s102s02_e-183210.pdf; Max Operating Temperature: 100°C; Package Reference: S202S02; Packaging: Rail/Tube; Output Current: 8A; Min Operating Temperature: -25°C; Case/Package: SIP
footprint SHRP-S202S02 (THD, 4-Leads, Body 5.7x18.7mm, Pitch 2.54mm)
pins: 1 OUTPUT, 2 OUTPUT, 3 INPUT(+), 4 INPUT(-)

## CMP-008-00001-4
designator K?, comment JV-5S-KT
Power Relay, 5 A, 125 Ohm, -40 to 70 degc, 4-Pin THD, RoHS; Manufacturer: Fujitsu; Contact Form: SPST; Current Rating: 5A; Operate Time: 8ms; Datasheet URL: http://www.fujitsu.com/downloads/MICRO/fcai/relays/jv.pdf; Max Operating Temperature: 70°C; Pins: 4; Datasheet Version: Apr-12; RoHS Compliant: True; Mounting Technology: ThroughHole; Min Operating Temperature: -40°C; Package Reference: JV-5S-KT; Package Description: 4-Pin Through Hole Device, Body 17.5 x 10 mm, Picth 15.24 mm
footprint FJSU-JV-5S-KT_V (THD, 4-Leads, Body 17.5x10mm, Picth 15.24mm)
pins: 1, 2, 3, 4

## CMP-008-00002-4
designator K?, comment G4W-2214P-US-HP-DC12
DPST Power Relay,15 A, 12 V, -25 to 55 degC, 6-Pin THD, RoHS, Bulk; Manufacturer: Omron; Operate Time: 20ms; Current Rating: 15A; Mounting Technology: ThroughHole; Datasheet URL: https://datasheet.ciiva.com/15731/g4w-15731808.pdf; RoHS Compliant: True; Package Reference: G4W-2214P-US-HP-DC12; Package Description: 6-Pin Through Hole Device, Body 30.48 x 19.3 mm; Case/Package: DIP; Min Operating Temperature: -25°C; Datasheet Version: Oct-12; Pins: 6; Max Operating Temperature: 55°C; Contact Form: DPST
footprint OMRON-G4W-2214P-US-HP-DC12_V (Relay, 6-Leads, Body 30.48x19.3mm)
pins: 1, 2, 3, 4, 5, 6

## CMP-008-00003-4
designator K?, comment 40.52.7.024.0000
Miniature PCB/Plug-in DPDT Relay, 8 A, 250 V AC, -40 to 85 degC, 8-Pin THD; Manufacturer: Finder; Operate Time: 7ms; Current Rating: 8A; RoHS Compliant: True; Datasheet Version: Jun-16; Datasheet URL: http://gfinder.findernet.com//assets/Series/353/S40EN.pdf; Mounting Technology: ThroughHole; Package Description: 8-Pin Through Hole Device, Body 29 x 12.4 mm; Pins: 8; Max Operating Temperature: 85°C; Min Operating Temperature: -40°C; Package Reference: 40.52.7.024.0000; Contact Form: DPDT
footprint FIND-40.52.7.024.0000_V (Relay, 8-Leads, Body 29x12.4mm)
pins: 11, 12, 14, 21, 22, 24, A, B

## CMP-008-00004-4
designator K?, comment RY210024
General Purpose Relay, 24 VDC, 8 A, -40 to 70 degC, 5-Pin THD, RoHS, Bulk; Manufacturer: TE Connectivity; Operate Time: 9ms; Contact Form: SPDT; Current Rating: 10A; Datasheet URL: http://www.te.com/commerce/DocumentDelivery/DDEController?Action=showdoc&DocId=Data+Sheet%7FRYII%7F0115%7Fpdf%7FEnglish%7FENG_DS_RYII_0115.pdf%7F3-1393224-8; Datasheet Version: Rev. 0115, 01/2015; Max Operating Temperature: 70°C; Mounting Technology: ThroughHole; Min Operating Temperature: -40°C; Package Description: 5-Pin Through Hole Device, Body 28.5 x 10.1 mm; Pins: 5; Package Reference: RY210024; RoHS Compliant: True
footprint TECO-RY210024_V (THD, 5-Leads, Body 28.5x10.1mm)
pins: 1, 2, 3, 4, 5

## CMP-009-00000-5
designator R?, comment Resistor 51k +/-5% 0402 63 mW  value 51k  Case/Package: 0402  Min Operating Temperature: -55°C  Mounting Technology: SM  RoHS Compliant: True  Max Operating Temperature: 155°C  Power: 63mW  Tolerance: 5%  Pins: 2
Chip Resistor, 51 KOhm, +/- 5%, 0.063 W, -55 to 155 degC, 0402 (1005 Metric)
footprint RESC1005X40X25NL05T10-16 (Chip Resistor, 2-Leads, Body 1.00x0.50mm, IPC Medium Density)
footprint RESC1005X40X25ML05T10-15 (Chip Resistor, 2-Leads, Body 1.00x0.50mm, IPC Low Density)
footprint RESC1005X40X25LL05T10-14 (Chip Resistor, 2-Leads, Body 1.00x0.50mm, IPC High Density)
pins: 1, 2

## CMP-009-00001-5
designator R?, comment Resistor 0R +/- 1% 0805 125 mW  value 0  Mounting Technology: SM  Voltage Rating: 150V  Max Operating Temperature: 155°C  Case/Package: 0805  RoHS Compliant: True  Pins: 2  Min Operating Temperature: -55°C  Tolerance: 1%  Power: 125mW
Chip Resistor, 0 Ohm, +/- 1%, 125 mW, -55 to 155 degC, 0805 (2012 Metric)
footprint RESC2013X50X35LL15T15 (Chip Resistor, 2-Leads, Body 2.2x1.4mm, IPC High Density)
footprint RESC2013X50X35ML15T15 (Chip Resistor, 2-Leads, Body 2.2x1.4mm, IPC Low Density)
footprint RESC2013X50X35NL15T15 (Chip Resistor, 2-Leads, Body 2.2x1.4mm, IPC Medium Density)
pins: 1, 2

## CMP-009-00002-5
designator R?, comment Resistor 0R +/- 5% 1206 250 mW  value 0  Tolerance: 5%  Min Operating Temperature: -55°C  Mounting Technology: SM  Max Operating Temperature: 155°C  Case/Package: 1206  Voltage Rating: 200V  RoHS Compliant: True  Power: 250mW  Pins: 2
Chip Resistor, 0 Ohm, +/- 5%, 0.25 W, -55 to 155 degC, 1206 (3216 Metric)
footprint RESC3216X60X45LL15T20 (Chip Resistor, 2-Leads, Body 3.3x1.75mm, IPC High Density)
footprint RESC3216X60X45NL15T20 (Chip Resistor, 2-Leads, Body 3.3x1.75mm, IPC Medium Density)
footprint RESC3216X60X45ML15T20 (Chip Resistor, 2-Leads, Body 3.3x1.75mm, IPC Low Density)
pins: 1, 2

## CMP-009-00003-5
designator R?, comment Resistor 0R +/- 5% 0402 63 mW  value 0  RoHS Compliant: True  Max Operating Temperature: 155°C  Mounting Technology: SM  Min Operating Temperature: -55°C  Power: 63mW  Tolerance: 5%  Voltage Rating: 50V  Case/Package: 0402  Pins: 2
Chip Resistor, 0 Ohm, +/- 5%, 63 mW, -55 to 155 degC, 0402 (1005 Metric)
footprint RESC1005X40X25LL05T05-18 (Chip Resistor, 2-Leads, Body 1.00x0.50mm, IPC High Density)
footprint RESC1005X40X25ML05T05-19 (Chip Resistor, 2-Leads, Body 1.00x0.50mm, IPC Low Density)
footprint RESC1005X40X25NL05T05-20 (Chip Resistor, 2-Leads, Body 1.00x0.50mm, IPC Medium Density)
pins: 1, 2

## CMP-009-00004-5
designator R?, comment Resistor 0R 0402 63 mW  value 0  Max Operating Temperature: 155°C  Pins: 2  RoHS Compliant: True  Power: 63mW  Min Operating Temperature: -55°C  Voltage Rating: 50V  Mounting Technology: SM  Case/Package: 0402
Chip Resistor, 0 Ohm, 0.063 W, -55 to 155 degC, 0402 (1005 Metric)
footprint RESC1005X40X25NL05T10 (Chip Resistor, 2-Leads, Body 1.00x0.50mm, IPC Medium Density)
footprint RESC1005X40X25ML05T10 (Chip Resistor, 2-Leads, Body 1.00x0.50mm, IPC Low Density)
footprint RESC1005X40X25LL05T10 (Chip Resistor, 2-Leads, Body 1.00x0.50mm, IPC High Density)
pins: 1, 2

## CMP-009-00005-5
designator R?, comment Resistor 0R +/- 5% 0402 100 mW  value 0  Pins: 2  Tolerance: 5%  Power: 100mW  Case/Package: 0402  Mounting Technology: SM  Max Operating Temperature: 155°C  Min Operating Temperature: -55°C  RoHS Compliant: True  Voltage Rating: 50V
Chip Resistor, 0 Ohm, 0.1 W, -55 to 155 degC, 0402 (1005 Metric)
footprint RESC1005X40X25LL05T05-7 (Chip Resistor, 2-Leads, Body 1.05x0.55mm, IPC High Density)
footprint RESC1005X40X25ML05T05-6 (Chip Resistor, 2-Leads, Body 1.05x0.55mm, IPC Low Density)
footprint RESC1005X40X25NL05T05-8 (Chip Resistor, 2-Leads, Body 1.05x0.55mm, IPC Medium Density)
pins: 1, 2

## CMP-009-00006-5
designator R?, comment Resistor 0R +/- 5% 0603 100 mW  value 0  Power: 100mW  Max Operating Temperature: 155°C  RoHS Compliant: True  Mounting Technology: SM  Case/Package: 0603  Voltage Rating: 50V  Min Operating Temperature: -55°C  Tolerance: 5%  Pins: 2
Chip Resistor, 0 Ohm, 0.1 W, -55 to 155 degC, 0603 (1608 Metric)
footprint RESC1608X55X25ML10T15 (Chip Resistor, 2-Leads, Body 1.70x0.90mm, IPC Low Density)
footprint RESC1608X55X25LL10T15 (Chip Resistor, 2-Leads, Body 1.70x0.90mm, IPC High Density)
footprint RESC1608X55X25NL10T15 (Chip Resistor, 2-Leads, Body 1.70x0.90mm, IPC Medium Density)
pins: 1, 2

## CMP-009-00007-5
designator R?, comment Resistor 0R +/- 5% 0805 125 mW  value 0  RoHS Compliant: True  Power: 125mW  Max Operating Temperature: 155°C  Case/Package: 0805  Mounting Technology: SM  Min Operating Temperature: -55°C  Tolerance: 5%  Pins: 2  Voltage Rating: 50V
Chip Resistor, 0 Ohm, 0.125 W, -55 to 155 degC, 0805 (2012 Metric)
footprint RESC2013X60X35NL10T20 (Chip Resistor, 2-Leads, Body 2.1x1.35mm, IPC Medium Density)
footprint RESC2013X60X35LL10T20 (Chip Resistor, 2-Leads, Body 2.1x1.35mm, IPC High Density)
footprint RESC2013X60X35ML10T20 (Chip Resistor, 2-Leads, Body 2.1x1.35mm, IPC Low Density)
pins: 1, 2
